# Altium footprint library 19-Resistors.PcbLib: 199 footprints (part 5 of 13)
Each footprint in its own frame and in the unit in brackets; x right, y up, seen from the top. Pads: shape width x height; smd on the part's side, far side on the other; paste and mask are expansions set on the pad; w line width, h text height; cw(c..) or ccw(c..) is an arc to the next point about the centre after c.
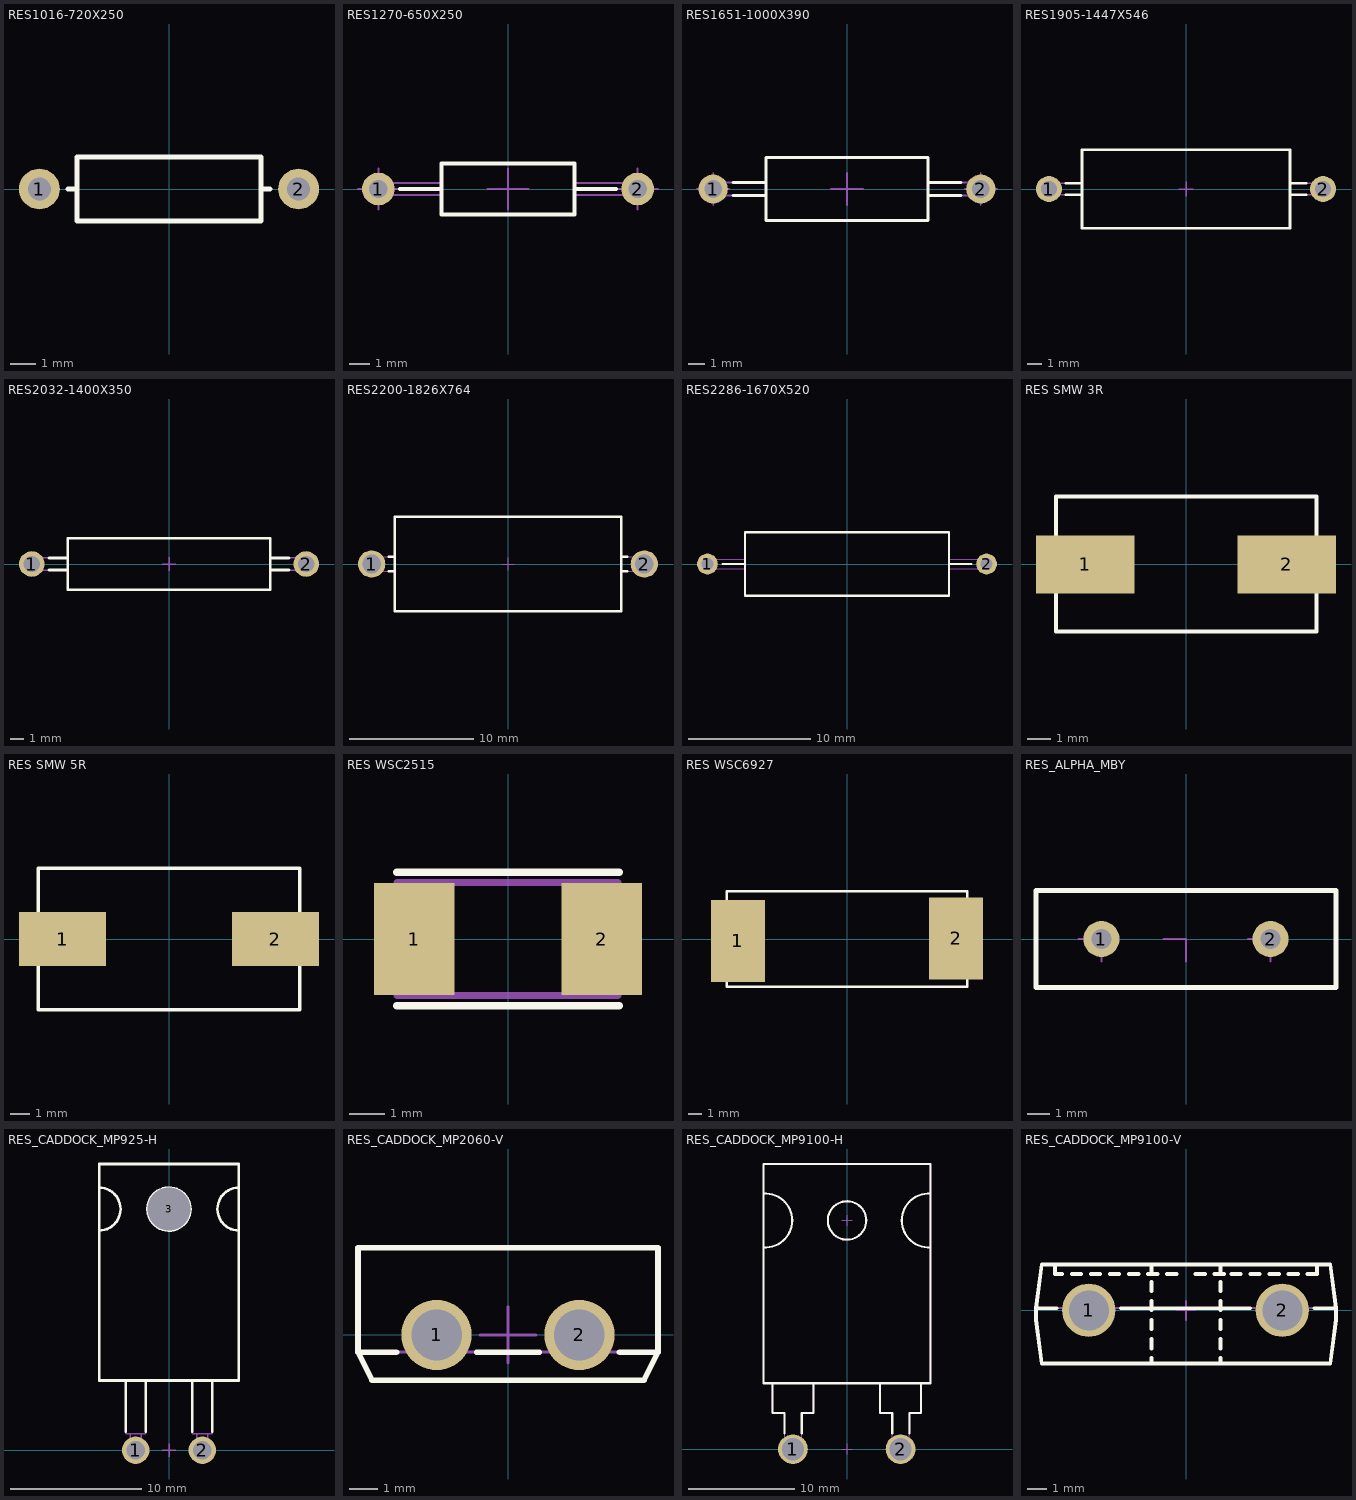
[diagram p4: the footprints below, top view; thin cyan lines are the x and y axes]

## RES1016-720X250 [mm] "Resistor, Axial, Pad spacing 10.16 mm - Body Lengh 7.2mm X Body Diameter 2.5mm"
height 2.5
pads (2):
  round 1.6 hole 0.9: 1(-5.08,0) 2(5.08,0)
Top Overlay:
  lines w0.2: -3.95,0 -3.6,0 ; 3.6,0 3.95,0 ; -3.6,-1.25 -3.6,1.25 3.6,1.25 3.6,-1.25 -3.6,-1.25
Mechanical 14:
  lines w0.1: -3.95,0 -3.6,0 ; 3.6,0 3.95,0 ; -3.6,-1.25 3.6,-1.25 3.6,1.25 -3.6,1.25 -3.6,-1.25
3D body "v160-090.stp": height 0.02, standoff -1.65, extent 4.28,-0.8 5.88,0.8
3D body "v160-090.stp": height 0.02, standoff -1.65, extent -5.88,-0.8 -4.28,0.8
3D body "RES1016-720X250.stp": height 2.5, standoff -3.2, extent -5.38,-1.25 5.38,1.25

## RES1270-650X250 [mm] "Resistor, Axial, Pad spacing 10.16 mm - Body Lengh 6.6mm X Body Diameter 2.5mm"
height 2.5
pads (2):
  round 1.6 hole 0.9: 1(-6.35,0) 2(6.35,0)
Top Overlay:
  lines w0.2: -5.292,0 -3.25,0 ; 3.25,0 5.292,0 ; -3.25,-1.25 3.25,-1.25 3.25,1.25 -3.25,1.25 -3.25,-1.25
Mechanical 8:
  lines w0.1: -7.35,0 -6.35,0 ; -6.35,-1 -6.35,0 ; -6.35,1 -6.35,0 ; -5.35,0 -6.35,0 ; -1,0 0,0 ; 0,-1 0,0 ; 0,1 0,0 ; 1,0 0,0 ; 5.35,0 6.35,0 ; 6.35,-1 6.35,0 ; 6.35,1 6.35,0 ; 7.35,0 6.35,0
Mechanical 14:
  lines w0.1: -3.25,-0.3 -6.336,-0.3 cw(c-6.35,0) -6.343,0.3 -3.25,0.3 ; 3.25,-0.3 6.35,-0.3 ccw(c6.35,0) 6.35,0.3 3.25,0.3 ; -3.25,-1.25 -3.25,1.25 3.25,1.25 3.25,-1.25 -3.25,-1.25
3D body "v160-090.stp": height 0.02, standoff -1.65, extent 5.55,-0.8 7.15,0.8
3D body "v160-090.stp": height 0.02, standoff -1.65, extent -7.15,-0.8 -5.55,0.8
3D body "RES1270-650X250.stp": height 2.5, standoff -3.6, extent -6.65,-1.25 6.65,1.25

## RES1651-1000X390 [mm] "Resistor, Axial, Pad spacing 16.51mm - Body Lengh 10mm X Body Diameter 3.9mm"
height 3.9
pads (2):
  round 1.8 hole 1.1: 1(-8.255,0) 2(8.255,0)
Top Overlay:
  lines w0.2: -7.018,-0.4 -5,-0.4 ; -7.018,0.4 -5,0.4 ; 5,-0.4 7.018,-0.4 ; 5,0.4 7.018,0.4 ; -5,-1.95 -5,1.95 ; -5,-1.95 5,-1.95 ; -5,-1.95 5,-1.95 ; -5,-1.95 -5,1.95 ; -5,1.95 5,1.95 ; -5,1.95 5,1.95 ; 5,-1.95 5,1.95 ; 5,-1.95 5,1.95
Mechanical 8:
  lines w0.1: -9.255,0 -8.255,0 ; -8.255,-1 -8.255,0 ; -8.255,1 -8.255,0 ; -7.255,0 -8.255,0 ; -1,0 0,0 ; 0,-1 0,0 ; 0,1 0,0 ; 1,0 0,0 ; 7.255,0 8.255,0 ; 8.255,-1 8.255,0 ; 8.255,1 8.255,0 ; 9.255,0 8.255,0
Mechanical 14:
  lines w0.1: -5,-0.4 -8.255,-0.4 cw(c-8.255,0) -8.255,0.4 -5,0.4 ; 5,-0.4 8.255,-0.4 ccw(c8.255,0) 8.255,0.4 5,0.4 ; -5,-1.95 -5,1.95 5,1.95 5,-1.95 -5,-1.95
3D body "v200-130.stp": height 0.02, standoff -1.65, extent 7.255,-1 9.255,1
3D body "v200-130.stp": height 0.02, standoff -1.65, extent -9.255,-1 -7.255,1
3D body "RES1651-1000X390.stp": height 3.9, standoff -3.8, extent -8.645,-1.95 8.645,1.95

## RES1905-1447X546 [mm] "Resistor, Axial, Pad spacing 19.05mm - Body Lengh 14.22mm X Body Diameter 5.21mm"
height 5.46
pads (2):
  round 1.8 hole 1.1: 1(-9.525,0) 2(9.525,0)
Top Overlay:
  lines w0.2: -8.341,-0.4 -7.235,-0.4 ; -8.341,0.4 -7.235,0.4 ; 7.235,-0.4 8.341,-0.4 ; 7.235,0.4 8.341,0.4 ; -7.235,-2.73 -7.235,2.73 7.235,2.73 7.235,-2.73 -7.235,-2.73
Mechanical 8:
  lines w0.1: -10.025,0 -9.525,0 ; -9.525,-0.5 -9.525,0 ; -9.525,0.5 -9.525,0 ; -9.025,0 -9.525,0 ; -0.5,0 0,0 ; 0,-0.5 0,0 ; 0,0.5 0,0 ; 0.5,0 0,0 ; 9.025,0 9.525,0 ; 9.525,-0.5 9.525,0 ; 9.525,0.5 9.525,0 ; 10.025,0 9.525,0
Mechanical 14:
  lines w0.1: -7.235,-0.4 -9.525,-0.4 cw(c-9.525,0) -9.525,0.4 -7.235,0.4 ; 7.235,-0.4 9.525,-0.4 ccw(c9.525,0) 9.525,0.4 7.235,0.4 ; -7.235,-2.73 -7.235,2.73 7.235,2.73 7.235,-2.73 -7.235,-2.73
3D body "v200-130.stp": height 0.02, standoff -1.65, extent 8.525,-1 10.525,1
3D body "v200-130.stp": height 0.02, standoff -1.65, extent -10.525,-1 -8.525,1
3D body "RES1905-1447X546.stp": height 5.46, standoff -3.6, extent -9.931,-2.73 9.932,2.73

## RES2032-1400X350 [mm] "Resistor, Axial, Pad spacing 20.32mm - Body Lengh 14mm X Body Diameter 3.5mm"
height 3.8
pads (2):
  round 1.9 hole 1.2: 1(-10.16,0) 2(10.16,0)
Top Overlay:
  lines w0.2: -8.887,-0.45 -7.5,-0.45 ; -8.887,0.45 -7.5,0.45 ; 7.5,-0.45 8.887,-0.45 ; 7.5,0.45 8.887,0.45 ; -7.5,-1.9 -7.5,1.9 7.5,1.9 7.5,-1.9 -7.5,-1.9
Mechanical 8:
  lines w0.1: -10.66,0 -10.16,0 ; -10.16,-0.5 -10.16,0 ; -10.16,0.5 -10.16,0 ; -9.66,0 -10.16,0 ; -0.5,0 0,0 ; 0,-0.5 0,0 ; 0,0.5 0,0 ; 0.5,0 0,0 ; 9.66,0 10.16,0 ; 10.16,-0.5 10.16,0 ; 10.16,0.5 10.16,0 ; 10.66,0 10.16,0
Mechanical 14:
  lines w0.1: -7.5,-0.45 -10.16,-0.45 cw(c-10.16,0) -10.16,0.45 -7.5,0.45 ; 7.5,-0.45 10.16,-0.45 ccw(c10.16,0) 10.16,0.45 7.5,0.45 ; -7.5,-1.9 -7.5,1.9 7.5,1.9 7.5,-1.9 -7.5,-1.9
3D body "v200-130.stp": height 0.02, standoff -1.65, extent 9.16,-1 11.16,1
3D body "v200-130.stp": height 0.02, standoff -1.65, extent -11.16,-1 -9.16,1
3D body "RES2032-1400X350.stp": height 3.8, standoff -3.6, extent -10.61,-1.9 10.61,1.9

## RES2200-1826X764 [mm] "Resistor, Axial, Pad spacing 22mm - Body Lengh 18.26mm X Body Diameter 7.64mm"
height 7.64
pads (2):
  round 2.2 hole 1.5: 1(-11,0) 2(11,0)
Top Overlay:
  lines w0.2: -9.625,-0.6 -9.13,-0.6 ; -9.625,0.6 -9.13,0.6 ; 9.13,-0.6 9.625,-0.6 ; 9.13,0.6 9.625,0.6 ; -9.13,-3.82 9.13,-3.82 9.13,3.82 -9.13,3.82 -9.13,-3.82
Mechanical 8:
  lines w0.1: -11.5,0 -11,0 ; -11,-0.5 -11,0 ; -11,0.5 -11,0 ; -10.5,0 -11,0 ; -0.5,0 0,0 ; 0,-0.5 0,0 ; 0,0.5 0,0 ; 0.5,0 0,0 ; 10.5,0 11,0 ; 11,-0.5 11,0 ; 11,0.5 11,0 ; 11.5,0 11,0
Mechanical 14:
  lines w0.1: -9.13,-3.82 9.13,-3.82 9.13,3.82 -9.13,3.82 -9.13,-3.82
Mechanical 15:
  lines w0.1: -9.13,-0.6 -11,-0.6 cw(c-11,0) -11,0.6 -9.13,0.6 ; 9.13,-0.6 11,-0.6 ccw(c11,0) 11,0.6 9.13,0.6
3D body "v200-130.stp": height 0.02, standoff -1.65, extent 10,-1 12,1
3D body "v200-130.stp": height 0.02, standoff -1.65, extent -12,-1 -10,1
3D body "RES2200-1826X764.stp": height 7.65, standoff -3.6, extent -11.6,-3.82 11.6,3.82

## RES2286-1670X520 [mm] "Resistor, Axial, Pad spacing 22.22 mm - Body Lengh 16.7mm X Body Diameter 5.2mm"
height 5.2
pads (2):
  round 1.7 hole 1: 1(-11.43,0) 2(11.43,0)
Top Overlay:
  lines w0.2: -10.16,0 -8.35,0 ; 8.35,0 10.16,0 ; -8.35,-2.6 8.35,-2.6 8.35,2.6 -8.35,2.6 -8.35,-2.6
Mechanical 14:
  lines w0.1: -11.43,-0.4 -8.35,-0.4 ; -11.43,0.4 -8.35,0.4 ; 8.35,-0.4 11.43,-0.4 ; 8.35,0.4 11.43,0.4 ; -8.35,-2.6 -8.35,2.6 8.35,2.6 8.35,-2.6 -8.35,-2.6
3D body "v200-130.stp": height 0.02, standoff -1.65, extent 10.43,-1 12.43,1
3D body "v200-130.stp": height 0.02, standoff -1.65, extent -12.43,-1 -10.43,1
3D body "RES2286-1670X520.stp": height 5.2, standoff -3.6, extent -11.82,-2.6 11.82,2.6

## RES SMW 3R [mm]
height 2.2
pads (2):
  rect 4.25x2.5 smd mask+0.07: 1(-4.35,0)
  rect 4.25x2.5 smd: 2(4.35,0)
Top Overlay:
  lines w0.178: -5.613,-2.896 -5.613,2.921 5.626,2.921 5.626,-2.896 -5.613,-2.896
3D body "res-sm-3w.stp": height 5, standoff 0, extent -5.45,-2.75 5.45,2.75
3D body "p425-250.stp": height 0.02, standoff 0, extent 2.225,-1.25 6.475,1.25
3D body "p425-250.stp": height 0.02, standoff 0, extent -6.475,-1.25 -2.225,1.25

## RES SMW 5R [mm]
height 2.2
pads (2):
  rect 4.5x2.8 smd: 1(-5.5,0)
  rect 4.5x2.8 smd mask+0.07: 2(5.5,0)
Top Overlay:
  lines w0.178: -6.75,-3.65 -6.75,3.65 6.75,3.65 6.75,-3.65 -6.75,-3.65
3D body "ressmw05.stp": height 6.8, standoff -0.3, extent -7.255,-3.429 7.061,3.371
3D body "p450-280.stp": height 0.02, standoff 0, extent -7.8,-1.4 -3.3,1.4
3D body "p450-280.stp": height 0.02, standoff 0, extent 3.275,-1.4 7.775,1.4

## RES WSC2515 [mm]
height 2.2
pads (2):
  rect 2.29x3.2 smd: 1(-2.67,0)
  rect 2.29x3.2 smd mask+0.07: 2(2.67,0)
Top Overlay:
  lines w0.2: -3.175,-1.9 3.175,-1.9 ; -3.175,1.9 3.175,1.9
Mechanical 15:
  lines w0.2: -3.162,-1.613 3.137,-1.613 3.137,1.613 -3.162,1.613 -3.162,-1.613
3D body "2_92-2_29.stp": height 0.02, standoff 0, extent 1.522,-1.612 3.812,1.308
3D body "2_92-2_29.stp": height 0.02, standoff 0, extent -3.825,-1.6 -1.535,1.32
3D body "2_92-2_29.stp": height 0.02, standoff 0, extent 1.522,-1.333 3.812,1.587
3D body "2_92-2_29.stp": height 0.02, standoff 0, extent -3.812,-1.32 -1.522,1.6
3D body "res6332_2515.stp": height 0.6, standoff 0, extent -3.15,-1.613 3.15,1.587

## RES WSC6927 [mm]
height 2.2
pads (2):
  rect 3.94x5.97 smd: 1(-7.94,-0.14)
  rect 3.94x5.97 smd mask+0.07: 2(7.94,0.038)
Top Overlay:
  lines w0.178: -8.765,-3.49 -8.765,3.49 8.765,3.49 8.765,-3.49 -8.765,-3.49
3D body "p597-394.stp": height 0.02, standoff 0, extent -9.895,-3.135 -5.955,2.835
3D body "p597-394.stp": height 0.02, standoff 0, extent 5.98,-2.935 9.92,3.035

## RES_ALPHA_MBY [mm] "Resistor, Radial, Pad spacing 7.5mm - Body 13.3mm X 4.3mm X 10.3mm H"
height 10.3
pads (2):
  round 1.6 hole 0.9: 1(-3.75,0) 2(3.75,0)
Top Overlay:
  lines w0.2: -6.65,-2.15 -6.65,2.15 6.65,2.15 6.65,-2.15 -6.65,-2.15
Mechanical 8:
  lines w0.1: -4.75,0 -3.75,0 -3.75,-1 ; -1,0 0,0 0,-1 ; 2.75,0 3.75,0 3.75,-1
Mechanical 14:
  lines w0.1: -6.65,-2.15 6.65,-2.15 6.65,2.15 -6.65,2.15 -6.65,-2.15
3D body "v160-090.stp": height 0.02, standoff -1.65, extent 2.95,-0.8 4.55,0.8
3D body "v160-090.stp": height 0.02, standoff -1.65, extent -4.55,-0.8 -2.95,0.8
3D body "RES_ALPHA_MBY.stp": height 10.3, standoff -3.1, extent -6.65,-2.15 6.65,2.15

## RES_CADDOCK_MP925-H [mm] "CADDOCK MP925 Serie TO-220 Style, Power Film Resistors"
height 3.44
pads (3):
  round 2.1 hole 1.4: 1(-2.54,0) 2(2.54,0)
  round 1 hole 3.3 unplated: 3(0,18.4)
Top Overlay:
  circle w0.2: c0,18.4 r1.64
  lines w0.2: -5.335,16.76 ccw(c-5.335,18.4) -5.335,20.04 ; -3.305,1.4 -3.305,5.32 -1.775,5.32 -1.775,1.4 ; -0.765,5.32 0.765,5.32 ; 1.775,1.4 1.775,5.32 3.305,5.32 3.305,1.4 ; 5.335,16.76 cw(c5.335,18.4) 5.335,20.04 ; -5.335,5.32 5.335,5.32 5.335,21.84 -5.335,21.84 -5.335,5.32
Mechanical 8:
  lines w0.1: -3.04,0 -2.54,0 ; -2.54,-0.5 -2.54,0 ; -2.54,0.5 -2.54,0 ; -2.04,0 -2.54,0 ; -0.5,0 0,0 ; -0.5,18.4 0,18.4 ; 0,-0.5 0,0 ; 0,0.5 0,0 ; 0,17.9 0,18.4 ; 0,18.9 0,18.4 ; 0.5,0 0,0 ; 0.5,18.4 0,18.4 ; 2.04,0 2.54,0 ; 2.54,-0.5 2.54,0 ; 2.54,0.5 2.54,0 ; 3.04,0 2.54,0
Mechanical 14:
  lines w0.1: -2.97,1.26 -2.97,-0.37 -2.11,-0.37 -2.11,1.26 ; -0.765,5.32 0.765,5.32 ; 2.11,1.26 2.11,-0.37 2.97,-0.37 2.97,1.26 ; -5.335,5.32 5.335,5.32 5.335,21.84 -5.335,21.84 -5.335,5.32 ; -3.305,1.26 -3.305,5.32 -1.775,5.32 -1.775,1.26 -3.305,1.26 ; 1.775,1.26 1.775,5.32 3.305,5.32 3.305,1.26 1.775,1.26
3D body "RES_CADDOCK_MP925_H.stp": height 3.44, standoff -3.6, extent -5.335,-0.37 5.335,21.84
3D body "v200-130.stp": height 0.02, standoff -1.65, extent -3.55,-1.075 -1.55,0.925
3D body "v200-130.stp": height 0.02, standoff -1.65, extent 1.54,-1 3.54,1

## RES_CADDOCK_MP2060-V [mm] "CADDOCK MP3060 Serie, Radial Power Clip Mount Resistor, Pad spacing 5.08mm"
height 21.09
pads (2):
  round 2.5 hole 1.8: 1(-2.54,0) 2(2.54,0)
Top Overlay:
  lines w0.2: -3.965,-0.61 -5.335,-0.61 ; -1.115,-0.61 1.115,-0.61 ; 3.965,-0.61 5.335,-0.61 ; -5.335,-0.61 -5.335,3.1 5.335,3.1 5.335,-0.61 ; -5.335,-0.61 -4.835,-1.61 4.835,-1.61 5.335,-0.61
Mechanical 8:
  lines w0.1: -3.54,0 -2.54,0 ; -2.54,-1 -2.54,0 ; -2.54,1 -2.54,0 ; -1.54,0 -2.54,0 ; -1,0 0,0 ; 0,-1 0,0 ; 0,1 0,0 ; 1,0 0,0 ; 1.54,0 2.54,0 ; 2.54,-1 2.54,0 ; 2.54,1 2.54,0 ; 3.54,0 2.54,0
Mechanical 14:
  lines w0.1: -5.335,-0.61 5.335,-0.61 ; -5.335,-0.61 -5.335,3.1 5.335,3.1 5.335,-0.61 ; -5.335,-0.61 -4.835,-1.61 4.835,-1.61 5.335,-0.61
3D body "v200-130.stp": height 0.02, standoff -1.65, extent 1.54,-1 3.54,1
3D body "v200-130.stp": height 0.02, standoff -1.65, extent -3.54,-1 -1.54,1
3D body "RES_CADDOCK_MP2060.stp": height 21.72, standoff -3.4, extent -5.335,-1.61 5.335,3.1

## RES_CADDOCK_MP9100-H [mm] "CADDOCK MP9100 Serie TO-247 Style, Power Film Resistors"
height 5.21
pads (2):
  round 2.8 hole 2.1: 1(-5.105,0) 2(5.055,0)
Top Overlay:
  circle w0.2: c0,21.59 r1.815
  lines w0.2: -7.875,19.055 ccw(c-7.71,21.59) -7.875,24.125 ; -7.035,6.22 -7.035,3.43 -5.89,3.43 -5.89,1.5 ; -4.27,1.5 -4.27,3.43 -3.175,3.43 -3.175,6.22 ; 3.125,6.22 3.125,3.43 4.27,3.43 4.27,1.5 ; 5.89,1.5 5.89,3.43 6.985,3.43 6.985,6.22 ; 7.875,19.055 cw(c7.71,21.59) 7.875,24.125 ; -7.875,6.22 -7.875,26.92 7.875,26.92 7.875,6.22 -7.875,6.22
Mechanical 3:
  lines w0.1: -5.89,-0.455 -4.27,-0.455 ; 4.27,-0.455 5.89,-0.455
Mechanical 8:
  lines w0.1: -5.58,0 -5.08,0 ; -5.08,-0.5 -5.08,0 ; -5.08,0.5 -5.08,0 ; -4.58,0 -5.08,0 ; -0.5,0 0,0 ; -0.5,21.59 0,21.59 ; 0,-0.5 0,0 ; 0,0.5 0,0 ; 0,21.09 0,21.59 ; 0,22.09 0,21.59 ; 0.5,0 0,0 ; 0.5,21.59 0,21.59 ; 4.58,0 5.08,0 ; 5.08,-0.5 5.08,0 ; 5.08,0.5 5.08,0 ; 5.58,0 5.08,0
Mechanical 14:
  circle w0.1: c0,21.59 r1.815
  lines w0.1: -7.875,19.055 ccw(c-7.71,21.59) -7.875,24.125 ; -7.035,6.22 -7.035,3.43 -5.89,3.43 -5.89,-0.455 ; -4.27,-0.455 -4.27,3.43 -3.175,3.43 -3.175,6.22 ; 3.125,6.22 3.125,3.43 4.27,3.43 4.27,-0.455 ; 5.89,-0.455 5.89,3.43 6.985,3.43 6.985,6.22 ; 7.875,19.055 cw(c7.71,21.59) 7.875,24.125 ; -7.875,6.22 -7.875,26.92 7.875,26.92 7.875,6.22 -7.875,6.22
3D body "v200-130.stp": height 0.02, standoff -1.65, extent 4.055,-1 6.055,1
3D body "v200-130.stp": height 0.02, standoff -1.65, extent -6.105,-1 -4.105,1
3D body "RES_CADDOCK_MP9100_H.stp": height 5.21, standoff -3.8, extent -7.875,-0.455 7.875,26.92

## RES_CADDOCK_MP9100-V [mm] "CADDOCK MP9100 Serie TO-247 Style, Power Film Resistors"
height 27.3
pads (2):
  round 2.8 hole 2.1: 1(-5.105,0) 2(5.055,0)
Top Overlay:
  lines w0.2: -6.875,2.41 -6.875,1.91 -6.5,1.91 ; -6.801,0.11 -7.875,0.11 ; -6,1.91 -5.5,1.91 ; -5,1.91 -4.5,1.91 ; -4,1.91 -3.5,1.91 ; -3.409,0.11 3.359,0.11 ; -3,1.91 -2.5,1.91 ; -2,1.91 -1.5,1.91 ; -1.815,-2.8 -1.815,-2.5 ; -1.815,-2 -1.815,-1.5 ; -1.815,-1 -1.815,-0.5 ; -1.815,0 -1.815,0.5 ; -1.815,1 -1.815,1.5 ; -1.815,2 -1.815,2.41 ; -1,1.91 -0.5,1.91 ; 0.5,1.91 1,1.91 ; 1.5,1.91 2,1.91 ; 1.815,-2.8 1.815,-2.5 ; 1.815,-2 1.815,-1.5 ; 1.815,-1 1.815,-0.5 ; 1.815,0 1.815,0.5 ; 1.815,1 1.815,1.5 ; 1.815,2 1.815,2.41 ; 2.375,1.91 2.875,1.91 ; 3.375,1.91 3.875,1.91 ; 4.375,1.91 4.875,1.91 ; 5.375,1.91 5.875,1.91 ; 6.375,1.91 6.875,1.91 6.875,2.41 ; 6.751,0.11 7.875,0.11 ; -7.875,0.11 -7.575,2.41 7.575,2.41 7.875,0.11 ; -7.875,0.11 -7.875,-0.5 -7.575,-2.8 7.575,-2.8 7.875,-0.5 7.875,0.11
Mechanical 8:
  lines w0.1: -5.605,0 -5.105,0 ; -5.105,-0.5 -5.105,0 ; -5.105,0.5 -5.105,0 ; -4.605,0 -5.105,0 ; -0.5,0 0,0 ; 0,-0.5 0,0 ; 0,0.5 0,0 ; 0.5,0 0,0 ; 4.555,0 5.055,0 ; 5.055,-0.5 5.055,0 ; 5.055,0.5 5.055,0 ; 5.555,0 5.055,0
Mechanical 14:
  lines w0.1: -6.875,2.41 -6.875,1.91 -6.5,1.91 ; -6,1.91 -5.5,1.91 ; -5,1.91 -4.5,1.91 ; -4,1.91 -3.5,1.91 ; -3,1.91 -2.5,1.91 ; -2,1.91 -1.5,1.91 ; -1.815,-2.8 -1.815,-2.5 ; -1.815,-2 -1.815,-1.5 ; -1.815,-1 -1.815,-0.5 ; -1.815,0 -1.815,0.5 ; -1.815,1 -1.815,1.5 ; -1.815,2 -1.815,2.41 ; -1,1.91 -0.5,1.91 ; 0.5,1.91 1,1.91 ; 1.5,1.91 2,1.91 ; 1.815,-2.8 1.815,-2.5 ; 1.815,-2 1.815,-1.5 ; 1.815,-1 1.815,-0.5 ; 1.815,0 1.815,0.5 ; 1.815,1 1.815,1.5 ; 1.815,2 1.815,2.41 ; 2.375,1.91 2.875,1.91 ; 3.375,1.91 3.875,1.91 ; 4.375,1.91 4.875,1.91 ; 5.375,1.91 5.875,1.91 ; 6.375,1.91 6.875,1.91 6.875,2.41 ; -7.875,0.11 -7.575,2.41 7.575,2.41 7.875,0.11 ; -7.875,0.11 -7.875,-0.5 -7.575,-2.8 7.575,-2.8 7.875,-0.5 7.875,0.11 ; -7.875,0.11 7.875,0.11
3D body "v200-130.stp": height 0.02, standoff -1.65, extent 4.055,-1 6.055,1
3D body "v200-130.stp": height 0.02, standoff -1.65, extent 4.055,-1 6.055,1
3D body "v200-130.stp": height 0.02, standoff -1.65, extent -6.105,-1 -4.105,1
3D body "RES_CADDOCK_MP9100_V.stp": height 27.33, standoff -3.8, extent -7.875,-2.8 7.875,2.41